# Altium footprint library Sheye-Inductance.PcbLib: 40 footprints (part 2 of 3)
Each footprint in its own frame and in the unit in brackets; x right, y up, seen from the top. Pads: shape width x height; smd on the part's side, far side on the other; paste and mask are expansions set on the pad; w line width, h text height; cw(c..) or ccw(c..) is an arc to the next point about the centre after c.
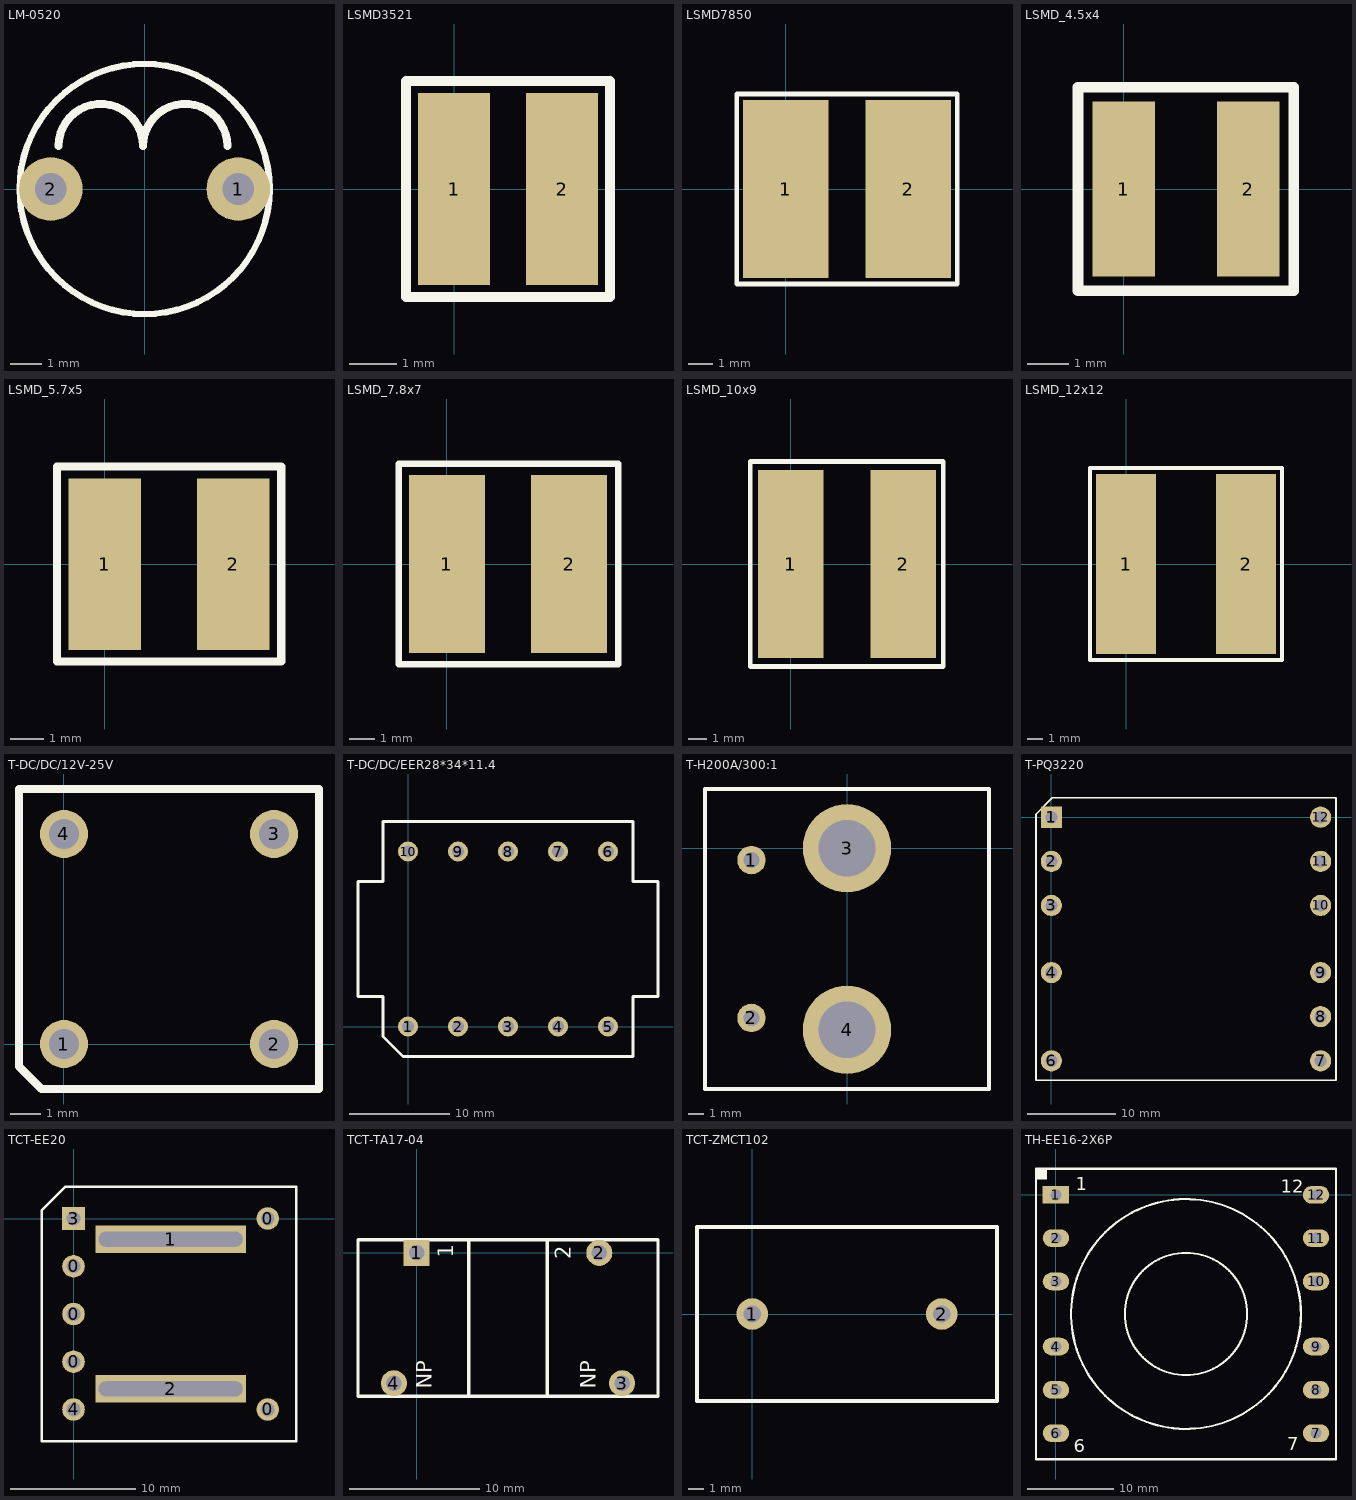
[diagram p1: the footprints below, top view; thin cyan lines are the x and y axes]

## LM-0520 [mil]
pads (2):
  round 80 hole 40: 1(118.11,0) 2(-118.11,0)
Top Overlay:
  circle w8: c0,0 r157.48
  lines w10: -108.27,54.13 cw(c-55.12,54.13) -1.97,54.13 cw(c51.18,54.13) 104.33,54.13
3D body: height 19.68, standoff -39.37, extent -134.26,-15.72 -102.89,15.72
3D body: height 19.68, standoff -39.37, extent 102.74,-15.72 134.11,15.72
3D body: height 570.87, standoff 19.68, extent -156.24,-157.17 157.48,157.17

## LSMD3521 [mil]
height 82.68
pads (2):
  rect 60x160 smd: 1(0,0) 2(90,0)
Top Overlay:
  lines w8: -40,-90 -40,90 130,90 130,-90 -40,-90
3D body: height 125.98, standoff 0, extent -15,-70 105,70

## LSMD7850 [mil]
height 196.85
pads (2):
  rect 140x290 smd: 1(0,0) 2(200,0)
Top Overlay:
  lines w8: -80,-155 -80,155 280,155 280,-155 -80,-155
3D body: height 196.85, standoff 0, extent -40,-155 240,155

## LSMD_4.5x4 [mm] "SMD7850"
pads (2):
  rect 1.5x4.2 smd: 1(0,0) 2(3,0)
Top Overlay:
  lines w0.254: -1.092,-2.438 4.089,-2.438 4.089,2.438 -1.092,2.438 -1.092,-2.438
3D body: height 3.2, standoff 0.2, extent -1.092,-2.438 4.089,2.438

## LSMD_5.7x5 [mm] "SMD7850"
pads (2):
  rect 2.2x5.2 smd: 1(0,0) 2(3.9,0)
Top Overlay:
  lines w0.254: -1.448,-2.946 -1.448,2.972 5.359,2.972 5.359,-2.946 -1.448,-2.946
3D body: height 4.7, standoff 0.2, extent -1.448,-2.946 5.359,2.972

## LSMD_7.8x7 [mm] "SMD7850"
pads (2):
  rect 3x7 smd: 1(0,0) 2(4.8,0)
Top Overlay:
  lines w0.254: -1.905,-3.937 -1.905,3.937 6.731,3.937 6.731,-3.937 -1.905,-3.937
3D body: height 5, standoff 0.2, extent -1.905,-3.937 6.731,3.937

## LSMD_10x9 [mm]
pads (2):
  rect 3.5x10 smd: 1(0,0) 2(6,0)
Top Overlay:
  lines w0.254: -2.159,-5.461 -2.159,5.461 8.128,5.461 8.128,-5.461 -2.159,-5.461
3D body: height 8, standoff 0.2, extent -1.778,-5.08 7.874,5.08

## LSMD_12x12 [mm]
pads (2):
  rect 4x12 smd: 1(0,0) 2(8,0)
Top Overlay:
  lines w0.254: -2.4,-6.4 -2.4,6.4 10.4,6.4 10.4,-6.4 -2.4,-6.4
3D body: height 8, standoff 0.2, extent -2.388,-6.401 10.414,6.401

## T-DC/DC/12V-25V [mm]
pads (4):
  round 1.6 hole 1: 1(0,0) 2(7,0) 3(7,7) 4(0,7)
Top Overlay:
  lines w0.254: -1.5,-0.75 -1.5,8.5 8.5,8.5 8.5,-1.5 -0.75,-1.5 -1.5,-0.75
3D body: height 9.6, standoff 4.5, extent -1.015,-0.95 7.95,8.032
3D body: height 4.5, standoff 0, extent -1.152,-1.152 8.152,8.152
3D body: height 0, standoff -4.5, extent -0.299,6.7 0.299,7.298
3D body: height 0, standoff -4.5, extent 6.701,6.7 7.299,7.298
3D body: height 0, standoff -4.5, extent -0.299,-0.3 0.299,0.298
3D body: height 0, standoff -4.5, extent 6.701,-0.3 7.3,0.298

## T-DC/DC/EER28*34*11.4 [mm]
pads (10):
  round 2 hole 1.2: 1(0,0) 2(5,0) 3(10,0) 4(15,0) 5(20,0) 6(20,17.5) 7(15,17.5) 8(10,17.5) 9(5,17.5) 10(0,17.5)
Top Overlay:
  lines w0.254: -5,3 -2.5,3 -2.5,-1 -0.5,-3 22.5,-3 22.5,3 25,3 25,14.5 22.5,14.5 22.5,20.5 -2.5,20.5 -2.5,14.5 -5,14.5 -5,3
3D body: height 0, standoff -3.5, extent -0.399,17.103 0.399,17.9
3D body: height 0, standoff -3.5, extent 4.601,17.103 5.399,17.9
3D body: height 0, standoff -3.5, extent 9.601,17.103 10.399,17.9
3D body: height 0, standoff -3.5, extent 14.601,17.103 15.399,17.9
3D body: height 0, standoff -3.5, extent 19.601,17.103 20.399,17.9
3D body: height 0, standoff -3.5, extent 19.601,-0.397 20.399,0.4
3D body: height 0, standoff -3.5, extent 14.601,-0.397 15.399,0.4
3D body: height 0, standoff -3.5, extent 9.601,-0.397 10.399,0.4
3D body: height 0, standoff -3.5, extent 4.601,-0.397 5.399,0.4
3D body: height 0, standoff -3.5, extent -0.399,-0.397 0.399,0.4
3D body: height 34, standoff 7, extent -5,2.999 25.001,14.5
3D body: height 7, standoff 0, extent -5.001,-3.001 25.001,20.501
3D body: height 28, standoff 7, extent -0.479,-1.75 20.479,19.167

## T-H200A/300:1 [mm]
pads (4):
  round 1.8 hole 1: 1(-6.05,-0.75) 2(-6.05,-10.75)
  round 5.6 hole 3.6: 3(0,0) 4(0,-11.5)
Top Overlay:
  lines w0.254: -9,-15.25 -2,-15.25 9,-15.25 9,3.75 -2,3.75 -9,3.75 -9,-15.25
3D body: height 0, standoff -4, extent -6.472,-11.174 -5.675,-10.376
3D body: height 0, standoff -4, extent -6.473,-1.125 -5.677,-0.327
3D body: height 10, standoff -6, extent -1.494,-13 1.494,-10.006
3D body: height 10, standoff -6, extent -1.544,-1.569 1.444,1.425
3D body: height 11.49, standoff 8.5, extent -1.5,-11.75 1.494,0.25
3D body: height 18.93, standoff 1, extent -9,-9.75 8.964,-1.75
3D body: height 1, standoff 0, extent -9,-15.25 9,3.75

## T-PQ3220 [mm]
pads (11):
  rect 2.4x2.4 hole 1.4: 1(0,0)
  round 2.4 hole 1.4: 2(0,-5) 3(0,-10) 4(0,-17.6) 6(0,-27.6) 7(30.5,-27.6) 8(30.5,-22.6) 9(30.5,-17.6) 10(30.5,-10) 11(30.5,-5) 12(30.5,0)
Top Overlay:
  lines w0.2: -1.75,-29.8 -1.75,0.35 0.1,2.2 32.25,2.2 32.25,-29.8 -1.75,-29.8
3D body: height 3, standoff -3, extent -0.996,-10.996 0.996,-9
3D body: height 3, standoff -3, extent -0.996,-5.996 0.996,-4
3D body: height 3, standoff -3, extent -0.996,-0.996 0.996,1
3D body: height 23, standoff 0, extent -1.85,-29.9 32.35,2.3
3D body: height 3, standoff -3, extent 29.504,-5.996 31.496,-4
3D body: height 3, standoff -3, extent -0.991,-18.608 1.002,-16.612
3D body: height 3, standoff -3, extent -0.996,-28.616 0.996,-26.62
3D body: height 3, standoff -3, extent 29.504,-28.616 31.496,-26.62
3D body: height 3, standoff -3, extent 29.504,-23.591 31.496,-21.595
3D body: height 3, standoff -3, extent 29.504,-0.996 31.496,1
3D body: height 3, standoff -3, extent 29.504,-10.996 31.496,-9
3D body: height 3, standoff -3, extent 29.504,-18.596 31.496,-16.6

## TCT-EE20 [mm]
pads (9):
  round 1.8 hole 1.1: 0(0,-11.43) 0(0,-7.62) 0(0,-3.81) 0(15.5,-15.24) 0(15.5,0) 4(0,-15.24)
  rect 12x2.2 hole 1.2 slot 11.5 at 0 deg: 1(7.747,-1.651) 2(7.747,-13.589)
  rect 1.8x1.8 hole 1.1: 3(0,0)
Top Overlay:
  lines w0.2: -2.54,0.635 -0.635,2.54 ; -2.54,0.635 -0.635,2.54 ; -2.54,0.635 -2.54,-17.78 17.78,-17.78 17.78,2.54 -0.635,2.54
3D body: height 17, standoff 0.2, extent -2.63,-18.698 17.87,3.302

## TCT-TA17-04 [mm]
pads (4):
  rect 2x2 hole 1.2: 1(0,0)
  round 2 hole 1.2: 2(14,0) 3(15.75,-10) 4(-1.75,-10)
Top Overlay:
  lines w0.254: 4,-11 4,1 ; 10,-11 10,1 ; -4.5,-11 -4.5,1 18.5,1 18.5,-11 -4.5,-11
  text "1" at 3.175,-0.381 h2
  text "2" at 12.192,-0.508 h2
  text "NP" at 1.524,-10.414 h2
  text "NP" at 14.097,-10.414 h2

## TCT-ZMCT102 [mm]
pads (2):
  round 2 hole 1.1: 1(0,0) 2(12,0)
Top Overlay:
  lines w0.254: -3.5,-5.5 15.5,-5.5 15.5,5.5 -3.5,5.5 -3.5,-5.5
3D body: height 10.2, standoff 1, extent -3.125,-5.182 15.138,5.018
3D body: height 19.28, standoff 1.05, extent -3.125,-5.182 15.138,5.018
3D body: height 1, standoff -1, extent -0.299,-0.294 0.299,0.305
3D body: height 1, standoff -1, extent 11.709,-0.299 12.307,0.299
3D body: height 13.18, standoff 7.2, extent 2.972,-5.276 8.96,5.124

## TH-EE16-2X6P [mil]
pads (12):
  rect 120x80 hole 50: 1(0,0)
  oval 120x80 hole 50: 2(0,-196.85) 3(0,-393.7) 4(0,-688.98) 5(0,-885.83) 6(0,-1082.68) 7(1181.1,-1082.68) 8(1181.1,-885.83) 9(1181.1,-688.98) 10(1181.1,-393.7) 11(1181.1,-196.85) 12(1181.1,0)
Top Overlay:
  circle w10: c590.55,-541.34 r277.56
  circle w10: c590.55,-541.34 r521.65
  rectangle: -90.55,70 -40,118.11
  lines w10: -90.55,-1200.79 -90.55,118.11 1271.65,118.11 1271.65,-1200.79 -90.55,-1200.79
  text "1" at 90,20 h60
  text "12" at 1020,10 h60
  text "7" at 1050,-1160 h60
  text "6" at 80,-1170 h60
3D body: height 1043.31, standoff 255.91, extent 82,-1052 1101.59,-30.4
3D body: height 1299.21, standoff 0, extent 390,-121 786,115
3D body: height 1299.21, standoff 0, extent 389.5,-1198 785.5,-962
3D body: height 255.91, standoff 0, extent 390,-1197.5 785,117.5
3D body: height 1299.21, standoff 1043.31, extent 390.5,-1198 785.5,117
3D body: height 255.91, standoff 0, extent 787.5,-1200 1022.5,115
3D body: height 1299.21, standoff 0, extent 787.5,-121 1022.5,115
3D body: height 1299.21, standoff 0, extent 787.5,-1201 1022.5,-965
3D body: height 1299.21, standoff 1043.31, extent 787.5,-1200 1022.5,115
3D body: height 1299.21, standoff 1043.31, extent 155,-1197.5 390,117.5
3D body: height 1299.21, standoff 0, extent 155,-118.5 390,117.5
3D body: height 1299.21, standoff 0, extent 154.5,-1198 389.5,-962
3D body: height 255.91, standoff 0, extent 155.5,-1198 390.5,117
3D body: height 216.54, standoff 98.43, extent 1022.5,-1200 1267,115
3D body: height 216.54, standoff 98.43, extent -89.5,-1197.5 155,117.5
3D body: height 98.43, standoff -59.06, extent -19.21,-19.65 20,19.65
3D body: height 98.43, standoff -59.06, extent -19.61,-216.29 19.61,-177
3D body: height 98.43, standoff -59.06, extent -19.21,-413.65 20,-374.35
3D body: height 98.43, standoff -59.06, extent -19.21,-708.65 20,-669.35
3D body: height 98.43, standoff -59.06, extent -19.21,-905.65 20,-866.35
3D body: height 98.43, standoff -59.06, extent -19.61,-1102 19.61,-1062.71
3D body: height 98.43, standoff -59.06, extent 1161.79,-1102.65 1201,-1063.35
3D body: height 98.43, standoff -59.06, extent 1161.79,-905.65 1201,-866.35
3D body: height 98.43, standoff -59.06, extent 1161.79,-708.65 1201,-669.35
3D body: height 98.43, standoff -59.06, extent 1161.79,-413.65 1201,-374.35
3D body: height 98.43, standoff -59.06, extent 1161.79,-216.65 1201,-177.35
3D body: height 98.43, standoff -59.06, extent 1161.79,-19.65 1201,19.65